# Altium footprint library PcbLibUltimate (1).pcblib: 202 footprints (part 1 of 13)
Each footprint in its own frame and in the unit in brackets; x right, y up, seen from the top. Pads: shape width x height; smd on the part's side, far side on the other; paste and mask are expansions set on the pad; w line width, h text height; cw(c..) or ccw(c..) is an arc to the next point about the centre after c.
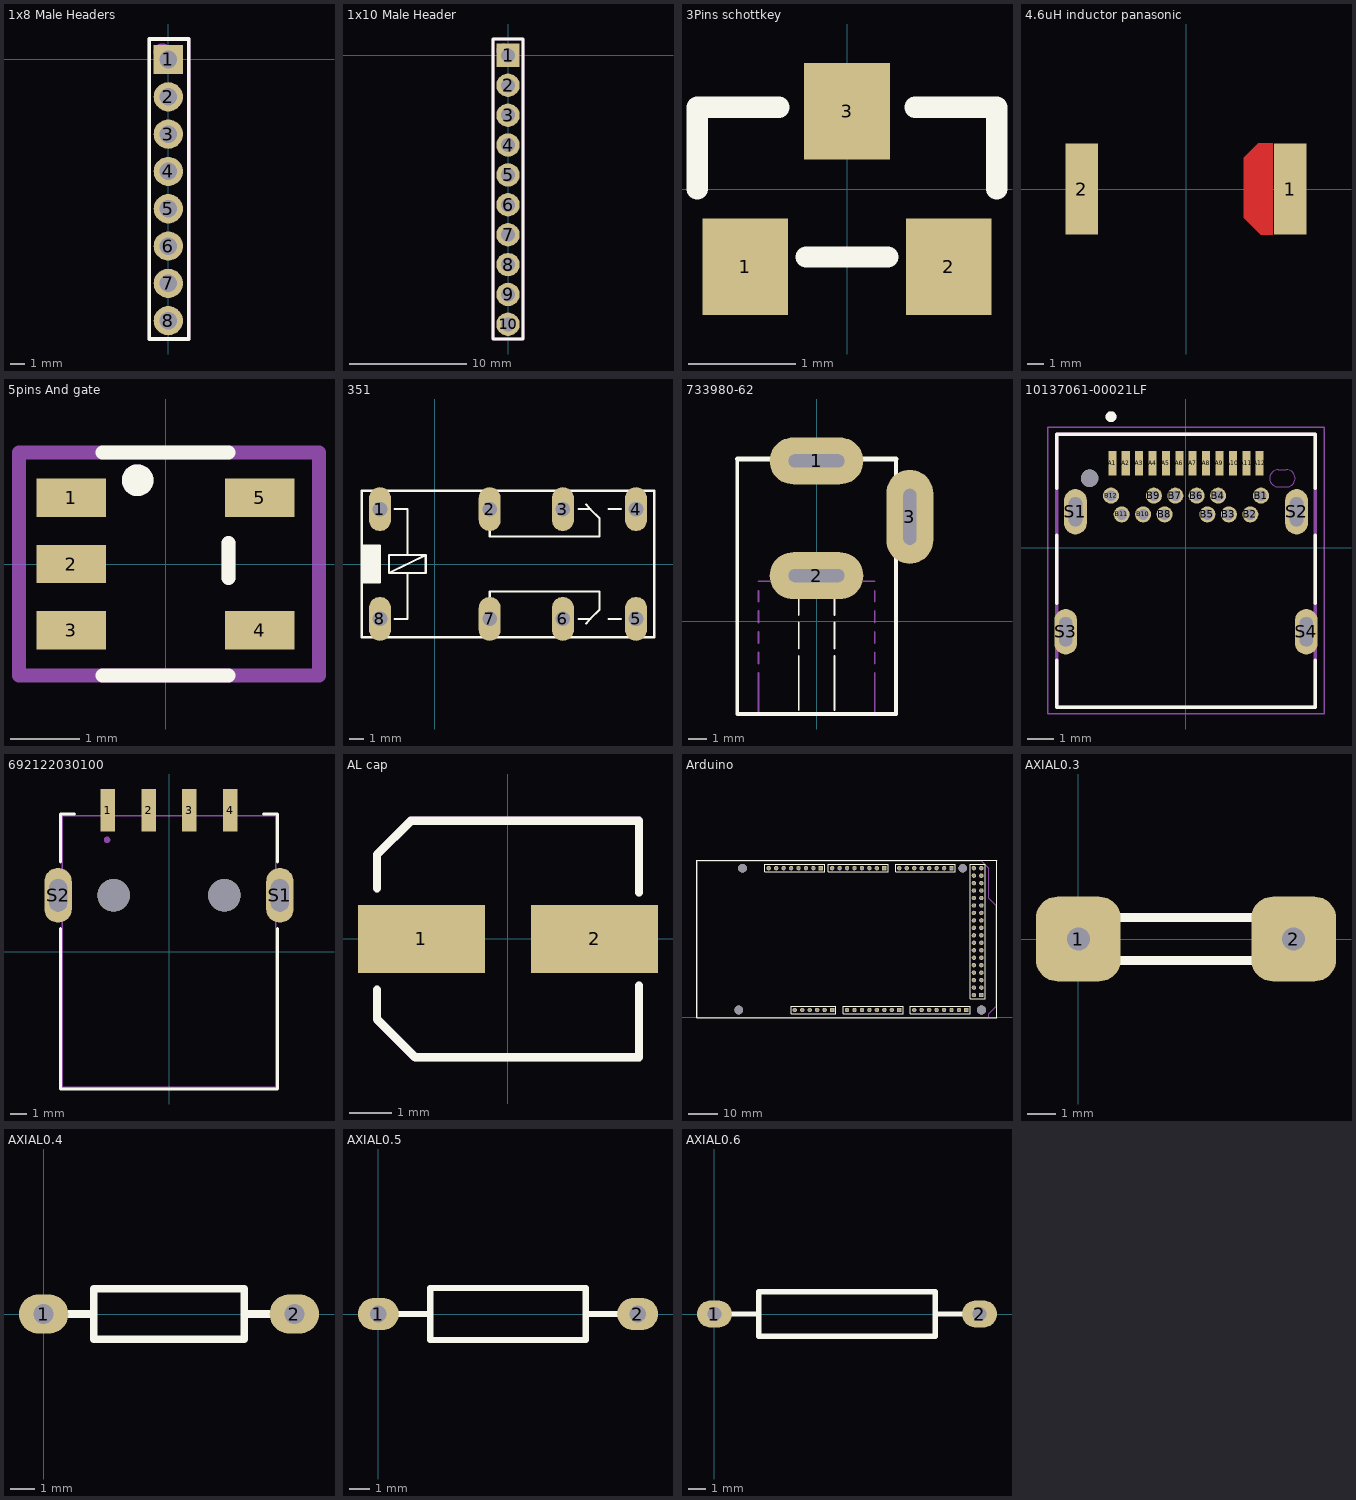
[diagram p0: the footprints below, top view; thin cyan lines are the x and y axes]

## 1x8 Male Headers [mm]
pads (8):
  rect 2x2 hole 1.2: 1(0,0)
  round 2 hole 1.2: 2(0,-2.55) 3(0,-5.1) 4(0,-7.65) 5(0,-10.2) 6(0,-12.75) 7(0,-15.3) 8(0,-17.85)
Top Overlay:
  lines w0.254: -1.3,-19.1 -1.3,0 -1.3,1.4 1.4,1.4 1.4,-19.1 -1.3,-19.1
Mechanical 2:
  circle w0.8: c-0.4,0.5 r0.2
  lines w0.254: -1.3,-19.1 1.4,-19.1 1.4,1.4 -1.3,1.4 -1.3,-19.1
  text ".Designator" at -0.5,-4.8 h1.52
3D body "61300811121 (rev1).stp": height 8.05, standoff -3.49, extent -1.24,-19.02 1.3,1.3

## 1x10 Male Header [mm]
pads (10):
  rect 2x2 hole 1.2: 1(0,0)
  round 2 hole 1.2: 2(0,-2.55) 3(0,-5.1) 4(0,-7.65) 5(0,-10.2) 6(0,-12.75) 7(0,-15.3) 8(0,-17.85) 9(0,-20.4) 10(0,-22.95)
Top Overlay:
  lines w0.254: -1.3,-24.2 -1.3,0.1 -1.3,1.4 1.3,1.4 1.3,-24.2 -1.3,-24.2
Mechanical 2:
  circle w0.8: c-0.4,0.4 r0.2
  lines w0.254: -1.3,-24.2 -1.3,1.4 1.3,1.4 1.3,-24.2 -1.3,-24.2
  text ".Designator" at -0.5,-5.7 h1.52
3D body "Download_STP_61301011121 (rev1).stp": height 8.55, standoff -2.99, extent -1.27,-24.1 1.27,1.3

## 3Pins schottkey [mm]
pads (3):
  rect 0.8x0.9 smd: 1(-0.95,-0.725) 2(0.95,-0.725) 3(0,0.725)
Top Overlay:
  lines w0.2: -1.397,0 -1.397,0.762 -0.635,0.762 ; -0.381,-0.635 0.381,-0.635 ; 0.635,0.762 1.397,0.762 1.397,0
3D body "BAT54CLT1G.stp": height 1.11, standoff 0, extent -1.46,-1.185 1.46,1.185

## 4.6uH inductor panasonic [mm]
pads (2):
  rect 2x5.6 smd: 1(6.4,0) 2(-6.4,0)
Top Layer:
  region: 5.334,2.794 4.445,2.794 3.556,1.905 3.556,-1.778 4.572,-2.794 5.334,-2.794
Top Overlay:
  region: 5.207,2.794
3D body "User Library-PCC-M0754M.step": height 5.4, standoff 0, extent -2.159,4.953 5.341,11.953
3D body "User Library-L Panasonic ETQP3MxxxKVN.STEP": height 3, standoff 0, extent -3.25,-3 3.25,3
3D body "pcsn5d33_l6_w6_h3-5.stp": height 3, standoff -3, extent -8.715,2.54 -2.715,6.09

## 5pins And gate [mm]
pads (5):
  rect 1x0.55 smd: 1(-1.35,0.95) 2(-1.35,0) 3(-1.35,-0.95) 4(1.35,-0.95) 5(1.35,0.95)
Top Overlay:
  circle w0.254: c-0.4,1.2 r0.1
  lines w0.2: -0.9,-1.6 0.9,-1.6 ; -0.9,1.6 0.9,1.6 ; 0.9,-0.2 0.9,0.3
Mechanical 29:
  circle w0.254: c-0.4,1.2 r0.1
  lines w0.2: -0.9,-1.6 0.9,-1.6 ; -0.9,1.6 0.9,1.6 ; 0.9,-0.2 0.9,0.3 ; -2.1,-1.6 2.2,-1.6 2.2,1.6 -2.1,1.6 -2.1,-1.6
  text "'.Designator'" at 0.8,-2.7 h1.52
3D body "User Library-TPS79333DBVR.step": height 1.59, standoff -0.03, extent -1.513,-1.525 1.514,1.525

## 28dip socket [mil]
3D body "dil_socket.stp": height 165.39, standoff -124.8, extent -49.21,-1348.42 348.43,49.22

## 351 [mil]
pads (8):
  oval 60x120 hole 40: 1(-150,150) 2(150,150) 3(350,150) 4(550,150) 5(550,-150) 6(350,-150) 7(150,-150) 8(-150,-150)
Top Overlay:
  rectangle: -200,-50 -150,50
  lines w6: -110,-150 -75,-150 -75,-25 ; -110,150 -75,150 -75,25 ; 150,-110 150,-75 450,-75 450,-125 425,-150 ; 150,110 150,75 450,75 450,125 425,150 ; 393,-150 425,-150 ; 393,150 425,150 ; 413,-163 425,-150 ; 413,163 425,150 ; 475,-150 508,-150 ; 475,150 508,150 ; -200,-50 -200,50 ; -200,-50 -150,-50 -150,50 -200,50 ; -200,-50 -200,-200 600,-200 600,200 -200,200 -200,50 ; -125,-25 -125,25 -75,25 ; -125,-25 -75,-25 ; -125,-25 -25,25 ; -75,-25 -25,-25 -25,25 ; -75,25 -25,25
3D body "g6a-274p_3dc.stp": height 330.71, standoff -124.41, extent -195.66,-195.27 599.61,202.37

## 733980-62 [mil]
pads (3):
  oval 198x99 hole 27.56 slot 118.11 at 0 deg: 1(0,338) 2(0,96)
  oval 99x198 hole 27.56 slot 118.11 at 90 deg: 3(197,220)
Top Overlay:
  lines w4: -37.4,-188.13 -37.4,-74.02 ; -37.4,-58.27 -37.4,-3.15 ; -37.4,13 -37.4,68 ; 38,-188.13 38,-74.02 ; 38,-58.27 38,-3.15 ; 38,13 38,68
  lines w8: -167.32,342 -167.32,-196 168,-196 168,342
  lines w10: -167.32,342 168,342
Mechanical 2:
  lines w4: -122.05,-192.06 -122.05,-109.45 ; -122.05,-89.76 -122.05,-66.14 ; -122.05,-46.46 -122.05,-22.83 ; -122.05,-3.15 -122.05,21 ; -122.05,41 -122.05,64 ; 123,-192.06 123,-109.45 ; 123,-89.76 123,-66.14 ; 123,-46.46 123,-22.83 ; 123,-3.15 123,21 ; 123,41 123,64
Mechanical 11:
  lines w0: -62.99,76 -62.99,115 63,115 63,76 -62.99,76 ; -62.99,318 -62.99,358 63,358 63,318 -62.99,318 ; 178,157 178,283 217,283 217,157 178,157
Mechanical 16:
  lines w4: -122.05,84 -98.43,84 ; -78.74,84 -55.12,84 ; -35.43,84 -11.81,84 ; 16,84 40,84 ; 56,84 79,84 ; 99,84 123,84
  lines w8: -167.32,342 168,342
3D body "User Library-rapc722.step": height 430, standoff -140, extent -176.57,-213.09 198.43,361.91

## 10137061-00021LF [mm]
pads (29):
  rect 0.3x0.9 smd: A1(-2.75,3.145) A2(-2.25,3.145) A3(-1.75,3.145) A4(-1.25,3.145) A5(-0.75,3.145) A6(-0.25,3.145) A7(0.25,3.145) A8(0.75,3.145) A9(1.25,3.145) A10(1.75,3.145) A11(2.25,3.145) A12(2.75,3.145)
  round 0.6 hole 0.4: B1(2.8,1.935) B2(2.4,1.235) B3(1.6,1.235) B4(1.2,1.935) B5(0.8,1.235) B6(0.4,1.935) B7(-0.4,1.935) B8(-0.8,1.235) B9(-1.2,1.935) B10(-1.6,1.235) B11(-2.4,1.235) B12(-2.8,1.935)
  oval 0.85x1.7 hole 0.5 slot 1.1 at 90 deg: S1(-4.13,1.335) S2(4.13,1.335) S3(-4.49,-3.145) S4(4.49,-3.145)
  round 0.65 hole 0.65 unplated: ""(-3.6,2.585)
Top Overlay:
  circle w0.2: c-2.8,4.885 r0.1
  lines w0.127: -4.825,-4.215 -4.825,-5.965 4.825,-5.965 4.825,-4.215 ; -4.825,-2.075 -4.825,0.455 ; -4.825,2.215 -4.825,4.235 4.825,4.235 4.825,2.215 ; 4.825,-2.075 4.825,0.455
Mechanical 1:
  lines w0: 3.45,2.26 cw(c3.45,2.585) 3.45,2.91 3.75,2.91 cw(c3.75,2.585) 3.75,2.26 3.45,2.26
Mechanical 13:
  circle w0.2: c-2.8,4.885 r0.1
  lines w0.127: -4.825,-5.965 -4.825,4.235 4.825,4.235 4.825,-5.965 -4.825,-5.965
Mechanical 15:
  lines w0.05: -5.165,-6.215 -5.165,4.485 5.17,4.485 5.17,-6.215 -5.165,-6.215
3D body "10137061c.stp": height 3.17, standoff -1.02, extent -4.825,-5.946 4.825,4.254

## 692122030100 [mm]
pads (8):
  rect 0.9x2.6 smd: 1(-3.75,8.67) 2(-1.25,8.67) 3(1.25,8.67) 4(3.75,8.67)
  oval 1.68x3.36 hole 1.12 slot 2 at 90 deg: S1(6.8,3.45) S2(-6.8,3.45)
  round 2 hole 2 unplated: ""(-3.4,3.45) ""(3.4,3.45)
Top Overlay:
  lines w0.2: -6.65,1.4 -6.65,-8.43 6.65,-8.43 6.65,1.4 ; -6.65,5.5 -6.65,8.39 ; -6.65,8.43 -5.8,8.43 ; 5.8,8.43 6.65,8.43 6.65,5.5
Mechanical 13:
  circle w0.2: c-3.8,6.85 r0.1
  lines w0.1: -6.55,-8.33 6.55,-8.33 6.55,8.33 -6.55,8.33 -6.55,-8.33
3D body "Download_STP_692122030100 (rev1) (1).stp": height 7.96, standoff -2.28, extent -7.677,-8.215 7.423,9.585

## AL cap [mm]
pads (2):
  rect 3x1.6 smd: 1(-2.05,0) 2(2.05,0)
Top Overlay:
  lines w0.2: -3.1,-1.2 -3.1,-1.85 -3.1,-1.9 -2.2,-2.8 3.1,-2.8 3.1,-1.1 ; -3.1,1.2 -3.1,2 ; -3.1,1.95 -3.1,2 ; 3.1,1.1 3.1,2.8 -2.3,2.8 -3.1,2
Mechanical 29:
  lines w0.2: -3.1,-1.2 -3.1,-1.9 -2.2,-2.8 3.1,-2.8 3.1,-1.1 ; -3.1,1.2 -3.1,2 -2.3,2.8 3.1,2.8 3.1,1.1
  text "'.Designator'" at -3.5,-0.5 h1.52
3D body "User Library-capacitor size C.step": height 5.41, standoff -0.01, extent -2.95,-2.65 2.95,2.65

## Arduino [mm] "Arduino Mega 2560"
pads (82):
  rect 1.5x1.5 hole 0.9: 0(69.96,50.76) 8(48.37,50.76) 21(92.82,50.76) 59(52.18,2.5) 67(75.04,2.5) 75(97.9,2.5) 79(102.98,7.58)
  round 1.5 hole 0.9: 1(67.42,50.76) 2(64.88,50.76) 3(62.34,50.76) 4(59.8,50.76) 5(57.26,50.76) 6(54.72,50.76) 7(52.18,50.76) 9(45.83,50.76) 10(43.29,50.76) 11(40.75,50.76) 12(38.21,50.76) 13(35.67,50.76) 14(75.04,50.76) 15(77.58,50.76) 16(80.12,50.76) 17(82.66,50.76) 18(85.2,50.76) 19(87.74,50.76) 20(90.28,50.76) 22(100.44,48.22) 23(102.98,48.22) 24(100.44,45.68) 25(102.98,45.68) 26(100.44,43.14) 27(102.98,43.14) 28(100.44,40.6) 29(102.98,40.6) 30(100.44,38.06) 31(102.98,38.06) 32(100.44,35.52) 33(102.98,35.52) 34(100.44,32.98) 35(102.98,32.98) 36(100.44,30.44) 37(102.98,30.44) 38(100.44,27.9) 39(102.98,27.9) 40(100.44,25.36) 41(102.98,25.36) 42(100.44,22.82) 43(102.98,22.82) 44(100.44,20.28) 45(102.98,20.28) 46(100.44,17.74) 47(102.98,17.74) 48(100.44,15.2) 49(102.98,15.2) 50(100.44,12.66) 51(102.98,12.66) 52(100.44,10.12) 53(102.98,10.12) 54(39.48,2.5) 55(42.02,2.5) 56(44.56,2.5) 57(47.1,2.5) 58(49.64,2.5) 60(57.26,2.5) 61(59.8,2.5) 62(62.34,2.5) 63(64.88,2.5) 64(67.42,2.5) 65(69.96,2.5) 66(72.5,2.5) 68(80.12,2.5) 69(82.66,2.5) 70(85.2,2.5) 71(87.74,2.5) 72(90.28,2.5) 73(92.82,2.5) 74(95.36,2.5) 76(33.13,50.76) 77(30.59,50.76) 78(100.44,7.58) 80(102.98,50.76) 81(100.44,50.76)
via 102.98,2.5 diameter 3 hole 3
via 96.63,50.76 diameter 3 hole 3
via 21.7,50.76 diameter 3 hole 3
via 20.43,2.5 diameter 3 hole 3
Top Overlay:
  lines w0.2: 29.32,49.49 49.64,49.49 49.64,52.03 29.32,52.03 29.32,49.49 ; 38.21,1.23 38.21,3.77 53.45,3.77 53.45,1.23 38.21,1.23 ; 50.91,49.49 71.23,49.49 71.23,52.03 50.91,52.03 50.91,49.49 ; 55.99,1.23 76.31,1.23 76.31,3.77 55.99,3.77 55.99,1.23 ; 73.77,49.49 73.77,52.03 94.09,52.03 94.09,49.49 73.77,49.49 ; 78.85,1.23 99.17,1.23 99.17,3.77 78.85,3.77 78.85,1.23 ; 99.17,6.31 104.25,6.31 104.25,52.03 99.17,52.03 99.17,6.31
  lines w0.254: 6.2,-0.2 108.3,-0.2 108.3,53.3 108.1,53.5 6.2,53.5 6.2,-0.2
Mechanical 1:
  lines w0.254: 105.52,40.59 108.06,38.05 108.06,3.77 105.52,1.23 105.52,-0.04 8.1,-0.04 6.46,-0.04 6.46,1.6 6.46,53.3 102.98,53.3 105.52,50.76 105.52,40.6
3D body "User Library-arduino_MEGA2650-1.STEP": height 12.66, standoff -2.59, extent 0.05,-0.07 108,53.27

## AXIAL0.3 [mm]
pads (2):
  rrect50% 3x3 hole 0.813: 1(0,0) 2(7.62,0)
Top Overlay:
  lines w0.305: 1.041,0 1.27,0 ; 6.579,0 6.35,0 ; 6.35,0 6.35,-0.762 1.27,-0.762 1.27,0.762 6.35,0.762 6.35,0

## AXIAL0.4 [mil]
pads (2):
  oval 78.74x62 hole 32: 1(0,0) 2(400,0)
Top Overlay:
  lines w12: 40,0 80,0 ; 320,0 360,0 ; 80,-40 80,40 320,40 320,-40 80,-40

## AXIAL0.5 [mil]
pads (2):
  oval 78.74x62 hole 32: 1(0,0) 2(500,0)
Top Overlay:
  lines w12: 40,0 100,0 ; 400,0 460,0 ; 100,-50 100,50 400,50 400,-50 100,-50

## AXIAL0.6 [mil]
pads (2):
  oval 78.74x62 hole 32: 1(0,0) 2(600,0)
Top Overlay:
  lines w12: 40,0 100,0 ; 500,0 560,0 ; 100,-50 500,-50 500,50 100,50 100,-50